# Altium footprint library 排针排座.PcbLib: 344 footprints (part 4 of 22)
Each footprint in its own frame and in the unit in brackets; x right, y up, seen from the top. Pads: shape width x height; smd on the part's side, far side on the other; paste and mask are expansions set on the pad; w line width, h text height; cw(c..) or ccw(c..) is an arc to the next point about the centre after c.
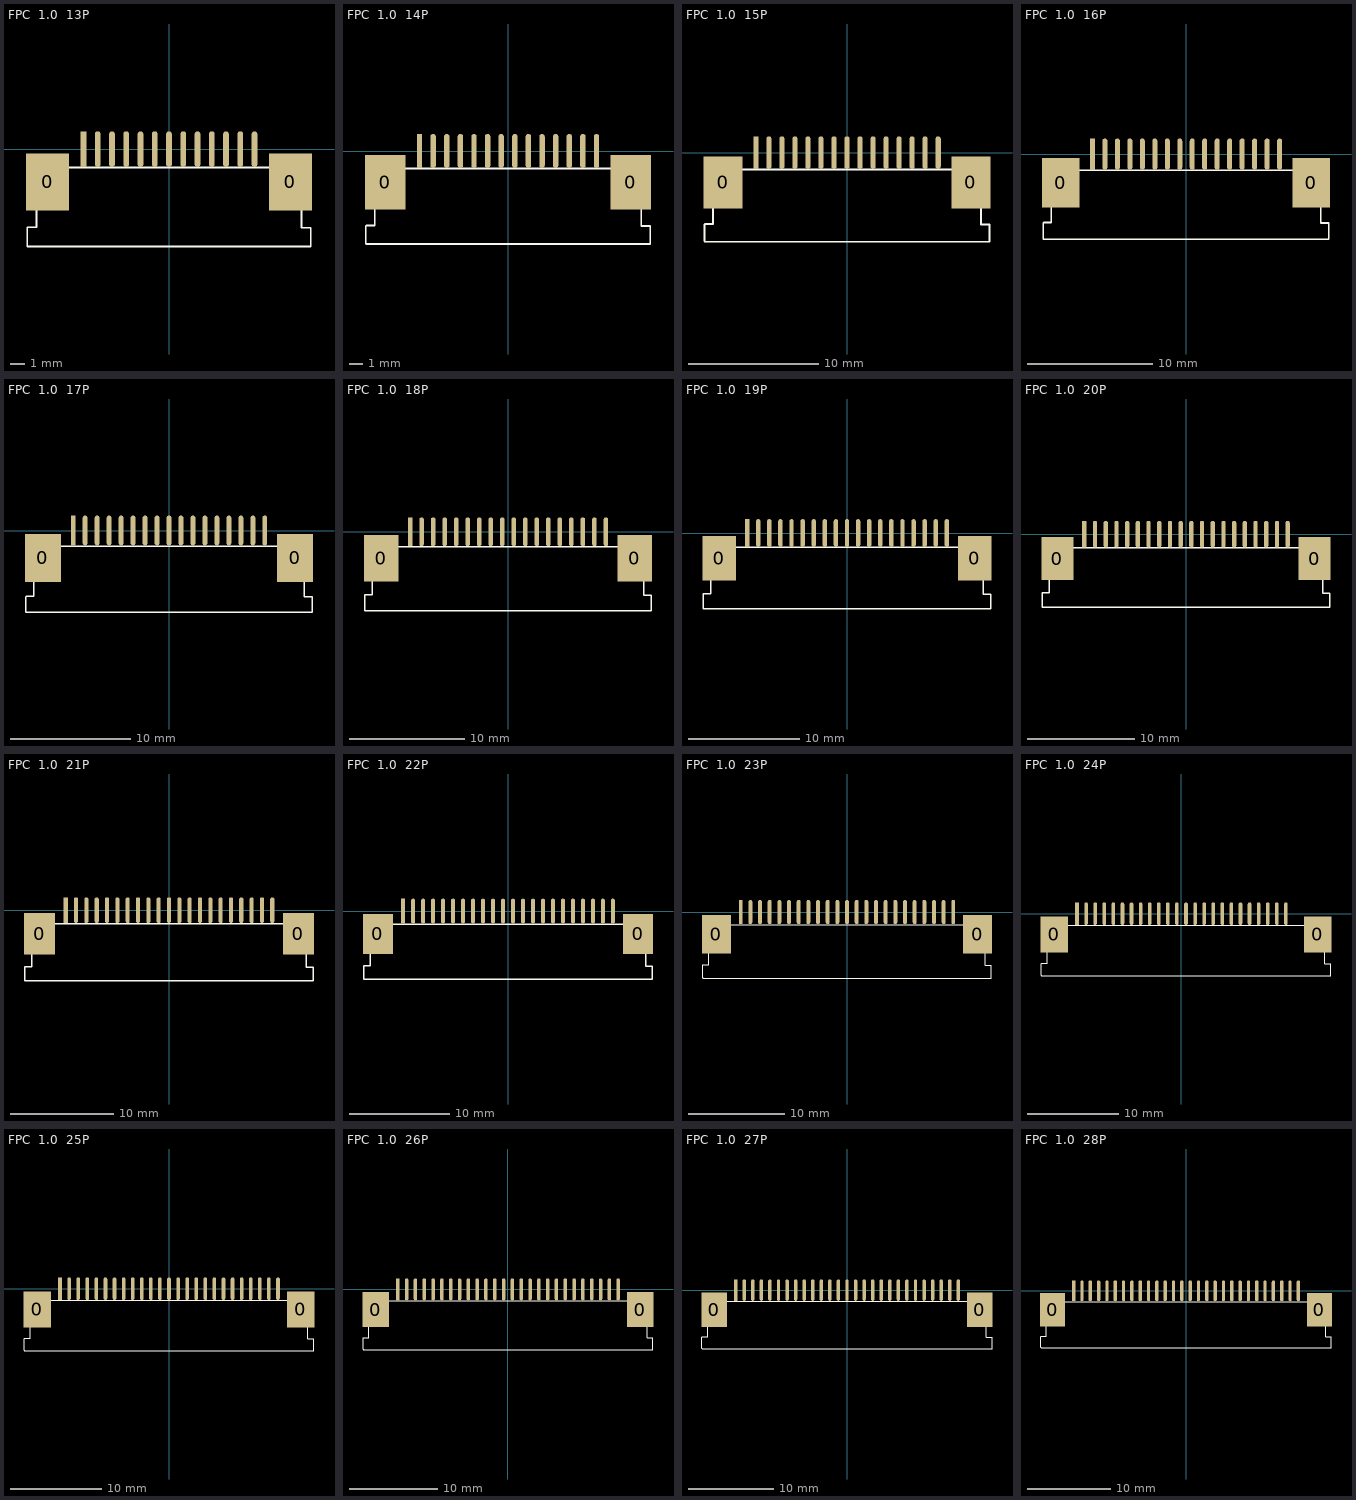
[diagram p3: the footprints below, top view; thin cyan lines are the x and y axes]

## FPC  1.0  13P [mm] "13 Pins"
height 2
pads (15):
  rect 3x4 smd: 0(-8.52,-2.289) 0(8.52,-2.289)
  rect 0.4x2.5 smd: 1(-6,0)
  oval 0.4x2.5 smd: 2(-5,0) 3(-4,0) 4(-3,0) 5(-2,0) 6(-1,0) 7(0,0) 8(1,0) 9(2,0) 10(3,0) 11(4,0) 12(5,0) 13(6,0)
Top Overlay:
  lines w0.127: -9.293,-1.295 -9.293,-5.474 -9.901,-5.474 -9.943,-5.515 -9.943,-6.807 -9.917,-6.833 9.943,-6.833 9.943,-5.513 9.293,-5.513 9.293,-1.293 -9.293,-1.293
3D body "FPC  1.0  13P.step": height 2.4, standoff 0, extent -9.9,-6.7 9.9,0

## FPC  1.0  14P [mm] "14 Pns"
height 2
pads (16):
  rect 3x4 smd: 0(-9.04,-2.289) 0(9,-2.289)
  rect 0.4x2.5 smd: 1(-6.52,0)
  oval 0.4x2.5 smd: 2(-5.52,0) 3(-4.52,0) 4(-3.52,0) 5(-2.52,0) 6(-1.52,0) 7(-0.52,0) 8(0.48,0) 9(1.48,0) 10(2.48,0) 11(3.48,0) 12(4.48,0) 13(5.48,0) 14(6.48,0)
Top Overlay:
  lines w0.127: -9.813,-1.295 -9.813,-5.474 -10.422,-5.474 -10.463,-5.515 -10.463,-6.807 -10.437,-6.833 10.423,-6.833 10.423,-5.513 9.773,-5.513 9.773,-1.293 -9.813,-1.293
3D body "FPC  1.0  14P.step": height 2.4, standoff 0, extent -10.4,-6.7 10.4,0

## FPC  1.0  15P [mm] "15 Pns"
height 2
pads (17):
  rect 3x4 smd: 0(-9.52,-2.289) 0(9.52,-2.289)
  rect 0.4x2.5 smd: 1(-7,0)
  oval 0.4x2.5 smd: 2(-6,0) 3(-5,0) 4(-4,0) 5(-3,0) 6(-2,0) 7(-1,0) 8(0,0) 9(1,0) 10(2,0) 11(3,0) 12(4,0) 13(5,0) 14(6,0) 15(7,0)
Top Overlay:
  lines w0.127: -10.293,-1.295 -10.293,-5.474 -10.901,-5.474 -10.943,-5.515 -10.943,-6.807 -10.917,-6.833 10.943,-6.833 10.943,-5.513 10.293,-5.513 10.293,-1.293 -10.293,-1.293
3D body "FPC  1.0  15P.step": height 2.4, standoff 0, extent -10.9,-6.7 10.9,0

## FPC  1.0  16P [mm] "16 Pns"
height 2
pads (18):
  rect 3x4 smd: 0(-10.031,-2.289) 0(10.009,-2.289)
  rect 0.4x2.5 smd: 1(-7.511,0)
  oval 0.4x2.5 smd: 2(-6.511,0) 3(-5.511,0) 4(-4.511,0) 5(-3.511,0) 6(-2.511,0) 7(-1.511,0) 8(-0.511,0) 9(0.489,0) 10(1.489,0) 11(2.489,0) 12(3.489,0) 13(4.489,0) 14(5.489,0) 15(6.489,0) 16(7.489,0)
Top Overlay:
  lines w0.127: -10.803,-1.295 -10.803,-5.474 -11.412,-5.474 -11.453,-5.515 -11.453,-6.807 -11.428,-6.833 11.432,-6.833 11.432,-5.513 10.782,-5.513 10.782,-1.293 -10.803,-1.293
3D body "FPC  1.0  16P.step": height 2.4, standoff 0, extent -11.4,-6.7 11.4,0

## FPC  1.0  17P [mm] "17 Pns"
height 2
pads (19):
  rect 3x4 smd: 0(-10.52,-2.289) 0(10.52,-2.289)
  rect 0.4x2.5 smd: 1(-8,0)
  oval 0.4x2.5 smd: 2(-7,0) 3(-6,0) 4(-5,0) 5(-4,0) 6(-3,0) 7(-2,0) 8(-1,0) 9(0,0) 10(1,0) 11(2,0) 12(3,0) 13(4,0) 14(5,0) 15(6,0) 16(7,0) 17(8,0)
Top Overlay:
  lines w0.127: -11.293,-1.295 -11.293,-5.474 -11.901,-5.474 -11.943,-5.515 -11.943,-6.807 -11.917,-6.833 11.943,-6.833 11.943,-5.513 11.293,-5.513 11.293,-1.293 -11.293,-1.293
3D body "FPC  1.0  17P.step": height 2.4, standoff 0, extent -11.9,-6.7 11.9,0

## FPC  1.0  18P [mm] "18 Pns"
height 2
pads (20):
  rect 3x4 smd: 0(-11.022,-2.289) 0(11.019,-2.289)
  rect 0.4x2.5 smd: 1(-8.501,0)
  oval 0.4x2.5 smd: 2(-7.501,0) 3(-6.501,0) 4(-5.501,0) 5(-4.501,0) 6(-3.501,0) 7(-2.501,0) 8(-1.501,0) 9(-0.501,0) 10(0.499,0) 11(1.499,0) 12(2.499,0) 13(3.499,0) 14(4.499,0) 15(5.499,0) 16(6.499,0) 17(7.499,0) 18(8.499,0)
Top Overlay:
  lines w0.127: -11.794,-1.295 -11.794,-5.474 -12.403,-5.474 -12.444,-5.515 -12.444,-6.807 -12.419,-6.833 12.442,-6.833 12.442,-5.513 11.792,-5.513 11.792,-1.293 -11.794,-1.293
3D body "FPC  1.0  18P.step": height 2.4, standoff 0, extent -12.4,-6.7 12.4,0

## FPC  1.0  19P [mm] "19 Pns"
height 2
pads (21):
  rect 3x4 smd: 0(-11.52,-2.289) 0(11.52,-2.289)
  rect 0.4x2.5 smd: 1(-9,0)
  oval 0.4x2.5 smd: 2(-8,0) 3(-7,0) 4(-6,0) 5(-5,0) 6(-4,0) 7(-3,0) 8(-2,0) 9(-1,0) 10(0,0) 11(1,0) 12(2,0) 13(3,0) 14(4,0) 15(5,0) 16(6,0) 17(7,0) 18(8,0) 19(9,0)
Top Overlay:
  lines w0.127: -12.293,-1.295 -12.293,-5.474 -12.901,-5.474 -12.943,-5.515 -12.943,-6.807 -12.917,-6.833 12.943,-6.833 12.943,-5.513 12.293,-5.513 12.293,-1.293 -12.293,-1.293
3D body "FPC  1.0  19P.step": height 2.4, standoff 0, extent -12.9,-6.7 12.9,0

## FPC  1.0  20P [mm] "20 Pns"
height 2
pads (22):
  rect 3x4 smd: 0(-12.038,-2.289) 0(12.003,-2.289)
  rect 0.4x2.5 smd: 1(-9.517,0)
  oval 0.4x2.5 smd: 2(-8.517,0) 3(-7.517,0) 4(-6.517,0) 5(-5.517,0) 6(-4.517,0) 7(-3.517,0) 8(-2.517,0) 9(-1.517,0) 10(-0.517,0) 11(0.483,0) 12(1.483,0) 13(2.483,0) 14(3.483,0) 15(4.483,0) 16(5.483,0) 17(6.483,0) 18(7.483,0) 19(8.483,0) 20(9.483,0)
Top Overlay:
  lines w0.127: -12.81,-1.295 -12.81,-5.474 -13.419,-5.474 -13.46,-5.515 -13.46,-6.807 -13.435,-6.833 13.426,-6.833 13.426,-5.513 12.776,-5.513 12.776,-1.293 -12.81,-1.293
3D body "FPC  1.0  20P.step": height 2.4, standoff 0, extent -13.4,-6.7 13.4,0

## FPC  1.0  21P [mm] "21 Pns"
height 2
pads (23):
  rect 3x4 smd: 0(-12.52,-2.289) 0(12.52,-2.289)
  rect 0.4x2.5 smd: 1(-10,0)
  oval 0.4x2.5 smd: 2(-9,0) 3(-8,0) 4(-7,0) 5(-6,0) 6(-5,0) 7(-4,0) 8(-3,0) 9(-2,0) 10(-1,0) 11(0,0) 12(1,0) 13(2,0) 14(3,0) 15(4,0) 16(5,0) 17(6,0) 18(7,0) 19(8,0) 20(9,0) 21(10,0)
Top Overlay:
  lines w0.127: -13.293,-1.295 -13.293,-5.474 -13.901,-5.474 -13.943,-5.515 -13.943,-6.807 -13.917,-6.833 13.943,-6.833 13.943,-5.513 13.293,-5.513 13.293,-1.293 -13.293,-1.293
3D body "FPC  1.0  21P.step": height 2.4, standoff 0, extent -13.9,-6.7 13.9,0

## FPC  1.0  22P [mm] "22 Pns"
height 2
pads (24):
  rect 3x4 smd: 0(-13.024,-2.289) 0(13.016,-2.289)
  rect 0.4x2.5 smd: 1(-10.504,0)
  oval 0.4x2.5 smd: 2(-9.504,0) 3(-8.504,0) 4(-7.504,0) 5(-6.504,0) 6(-5.504,0) 7(-4.504,0) 8(-3.504,0) 9(-2.504,0) 10(-1.504,0) 11(-0.504,0) 12(0.496,0) 13(1.496,0) 14(2.496,0) 15(3.496,0) 16(4.496,0) 17(5.496,0) 18(6.496,0) 19(7.496,0) 20(8.496,0) 21(9.496,0) 22(10.496,0)
Top Overlay:
  lines w0.127: -14.447,-6.807 -14.447,-5.515 -14.406,-5.474 -13.797,-5.474 -13.797,-1.293 13.789,-1.293 13.789,-5.513 14.439,-5.513 14.439,-6.833 -14.421,-6.833 -14.447,-6.807
3D body "FPC  1.0  22P.step": height 2.4, standoff 0, extent -14.4,-6.7 14.4,0

## FPC  1.0  23P [mm] "23 Pns"
height 2
pads (25):
  rect 3x4 smd: 0(-13.52,-2.289) 0(13.52,-2.289)
  rect 0.4x2.5 smd: 1(-11,0)
  oval 0.4x2.5 smd: 2(-10,0) 3(-9,0) 4(-8,0) 5(-7,0) 6(-6,0) 7(-5,0) 8(-4,0) 9(-3,0) 10(-2,0) 11(-1,0) 12(0,0) 13(1,0) 14(2,0) 15(3,0) 16(4,0) 17(5,0) 18(6,0) 19(7,0) 20(8,0) 21(9,0) 22(10,0) 23(11,0)
Top Overlay:
  lines w0.127: -14.293,-1.295 -14.293,-5.474 -14.901,-5.474 -14.943,-5.515 -14.943,-6.807 -14.917,-6.833 14.943,-6.833 14.943,-5.513 14.293,-5.513 14.293,-1.293 -14.293,-1.293
3D body "FPC  1.0  23P.step": height 2.4, standoff 0, extent -14.9,-6.7 14.9,0

## FPC  1.0  24P [mm] "24 Pns"
height 2
pads (26):
  rect 3x4 smd: 0(-14.015,-2.289) 0(15.025,-2.289)
  rect 0.4x2.5 smd: 1(-11.495,0)
  oval 0.4x2.5 smd: 2(-10.495,0) 3(-9.495,0) 4(-8.495,0) 5(-7.495,0) 6(-6.495,0) 7(-5.495,0) 8(-4.495,0) 9(-3.495,0) 10(-2.495,0) 11(-1.495,0) 12(-0.495,0) 13(0.505,0) 14(1.505,0) 15(2.505,0) 16(3.505,0) 17(4.505,0) 18(5.505,0) 19(6.505,0) 20(7.505,0) 21(8.505,0) 22(9.505,0) 23(10.505,0) 24(11.505,0)
Top Overlay:
  lines w0.127: -14.787,-1.295 -14.787,-5.474 -15.396,-5.474 -15.437,-5.515 -15.437,-6.807 -15.412,-6.833 16.448,-6.833 16.448,-5.513 15.798,-5.513 15.798,-1.293 -14.787,-1.293
3D body "FPC  1.0  24P.step": height 2.4, standoff 0, extent -15.4,-6.7 15.4,0

## FPC  1.0  25P [mm] "25 Pns"
height 2
pads (27):
  rect 3x4 smd: 0(-14.52,-2.289) 0(14.52,-2.289)
  rect 0.4x2.5 smd: 1(-12,0)
  oval 0.4x2.5 smd: 2(-11,0) 3(-10,0) 4(-9,0) 5(-8,0) 6(-7,0) 7(-6,0) 8(-5,0) 9(-4,0) 10(-3,0) 11(-2,0) 12(-1,0) 13(0,0) 14(1,0) 15(2,0) 16(3,0) 17(4,0) 18(5,0) 19(6,0) 20(7,0) 21(8,0) 22(9,0) 23(10,0) 24(11,0) 25(12,0)
Top Overlay:
  lines w0.127: -15.293,-1.295 -15.293,-5.474 -15.901,-5.474 -15.943,-5.515 -15.943,-6.807 -15.917,-6.833 15.943,-6.833 15.943,-5.513 15.293,-5.513 15.293,-1.293 -15.293,-1.293
3D body "FPC  1.0  25P.step": height 2.4, standoff 0, extent -15.9,-6.7 15.9,0

## FPC  1.0  26P [mm] "26 Pns"
height 2
pads (28):
  rect 3x4 smd: 0(-15.006,-2.289) 0(15.035,-2.289)
  rect 0.4x2.5 smd: 1(-12.485,0)
  oval 0.4x2.5 smd: 2(-11.485,0) 3(-10.485,0) 4(-9.485,0) 5(-8.485,0) 6(-7.485,0) 7(-6.485,0) 8(-5.485,0) 9(-4.485,0) 10(-3.485,0) 11(-2.485,0) 12(-1.485,0) 13(-0.485,0) 14(0.515,0) 15(1.515,0) 16(2.515,0) 17(3.515,0) 18(4.515,0) 19(5.515,0) 20(6.515,0) 21(7.515,0) 22(8.515,0) 23(9.515,0) 24(10.515,0) 25(11.515,0) 26(12.515,0)
Top Overlay:
  lines w0.127: -15.778,-1.295 -15.778,-5.474 -16.387,-5.474 -16.428,-5.515 -16.428,-6.807 -16.403,-6.833 16.458,-6.833 16.458,-5.513 15.808,-5.513 15.808,-1.293 -15.778,-1.293
3D body "FPC  1.0  26P.step": height 2.4, standoff 0, extent -16.4,-6.7 16.4,0

## FPC  1.0  27P [mm] "27 Pns"
height 2
pads (29):
  rect 3x4 smd: 0(-15.52,-2.289) 0(15.52,-2.289)
  rect 0.4x2.5 smd: 1(-13,0)
  oval 0.4x2.5 smd: 2(-12,0) 3(-11,0) 4(-10,0) 5(-9,0) 6(-8,0) 7(-7,0) 8(-6,0) 9(-5,0) 10(-4,0) 11(-3,0) 12(-2,0) 13(-1,0) 14(0,0) 15(1,0) 16(2,0) 17(3,0) 18(4,0) 19(5,0) 20(6,0) 21(7,0) 22(8,0) 23(9,0) 24(10,0) 25(11,0) 26(12,0) 27(13,0)
Top Overlay:
  lines w0.127: -16.293,-1.295 -16.293,-5.474 -16.901,-5.474 -16.943,-5.515 -16.943,-6.807 -16.917,-6.833 16.943,-6.833 16.943,-5.513 16.293,-5.513 16.293,-1.293 -16.293,-1.293
3D body "FPC  1.0  27P.step": height 2.4, standoff 0, extent -16.9,-6.7 16.9,0

## FPC  1.0  28P [mm] "28 Pns"
height 2
pads (30):
  rect 3x4 smd: 0(-16.022,-2.289) 0(16.019,-2.289)
  rect 0.4x2.5 smd: 1(-13.501,0)
  oval 0.4x2.5 smd: 2(-12.501,0) 3(-11.501,0) 4(-10.501,0) 5(-9.501,0) 6(-8.501,0) 7(-7.501,0) 8(-6.501,0) 9(-5.501,0) 10(-4.501,0) 11(-3.501,0) 12(-2.501,0) 13(-1.501,0) 14(-0.501,0) 15(0.499,0) 16(1.499,0) 17(2.499,0) 18(3.499,0) 19(4.499,0) 20(5.499,0) 21(6.499,0) 22(7.499,0) 23(8.499,0) 24(9.499,0) 25(10.499,0) 26(11.499,0) 27(12.499,0) 28(13.499,0)
Top Overlay:
  lines w0.127: -16.794,-1.295 -16.794,-5.474 -17.403,-5.474 -17.444,-5.515 -17.444,-6.807 -17.419,-6.833 17.442,-6.833 17.442,-5.513 16.792,-5.513 16.792,-1.293 -16.794,-1.293
3D body "FPC  1.0  28P.step": height 2.4, standoff 0, extent -17.4,-6.7 17.4,0